# Altium footprint library Ixora.PcbLib: 199 footprints (part 2 of 13)
Each footprint in its own frame and in the unit in brackets; x right, y up, seen from the top. Pads: shape width x height; smd on the part's side, far side on the other; paste and mask are expansions set on the pad; w line width, h text height; cw(c..) or ccw(c..) is an arc to the next point about the centre after c.
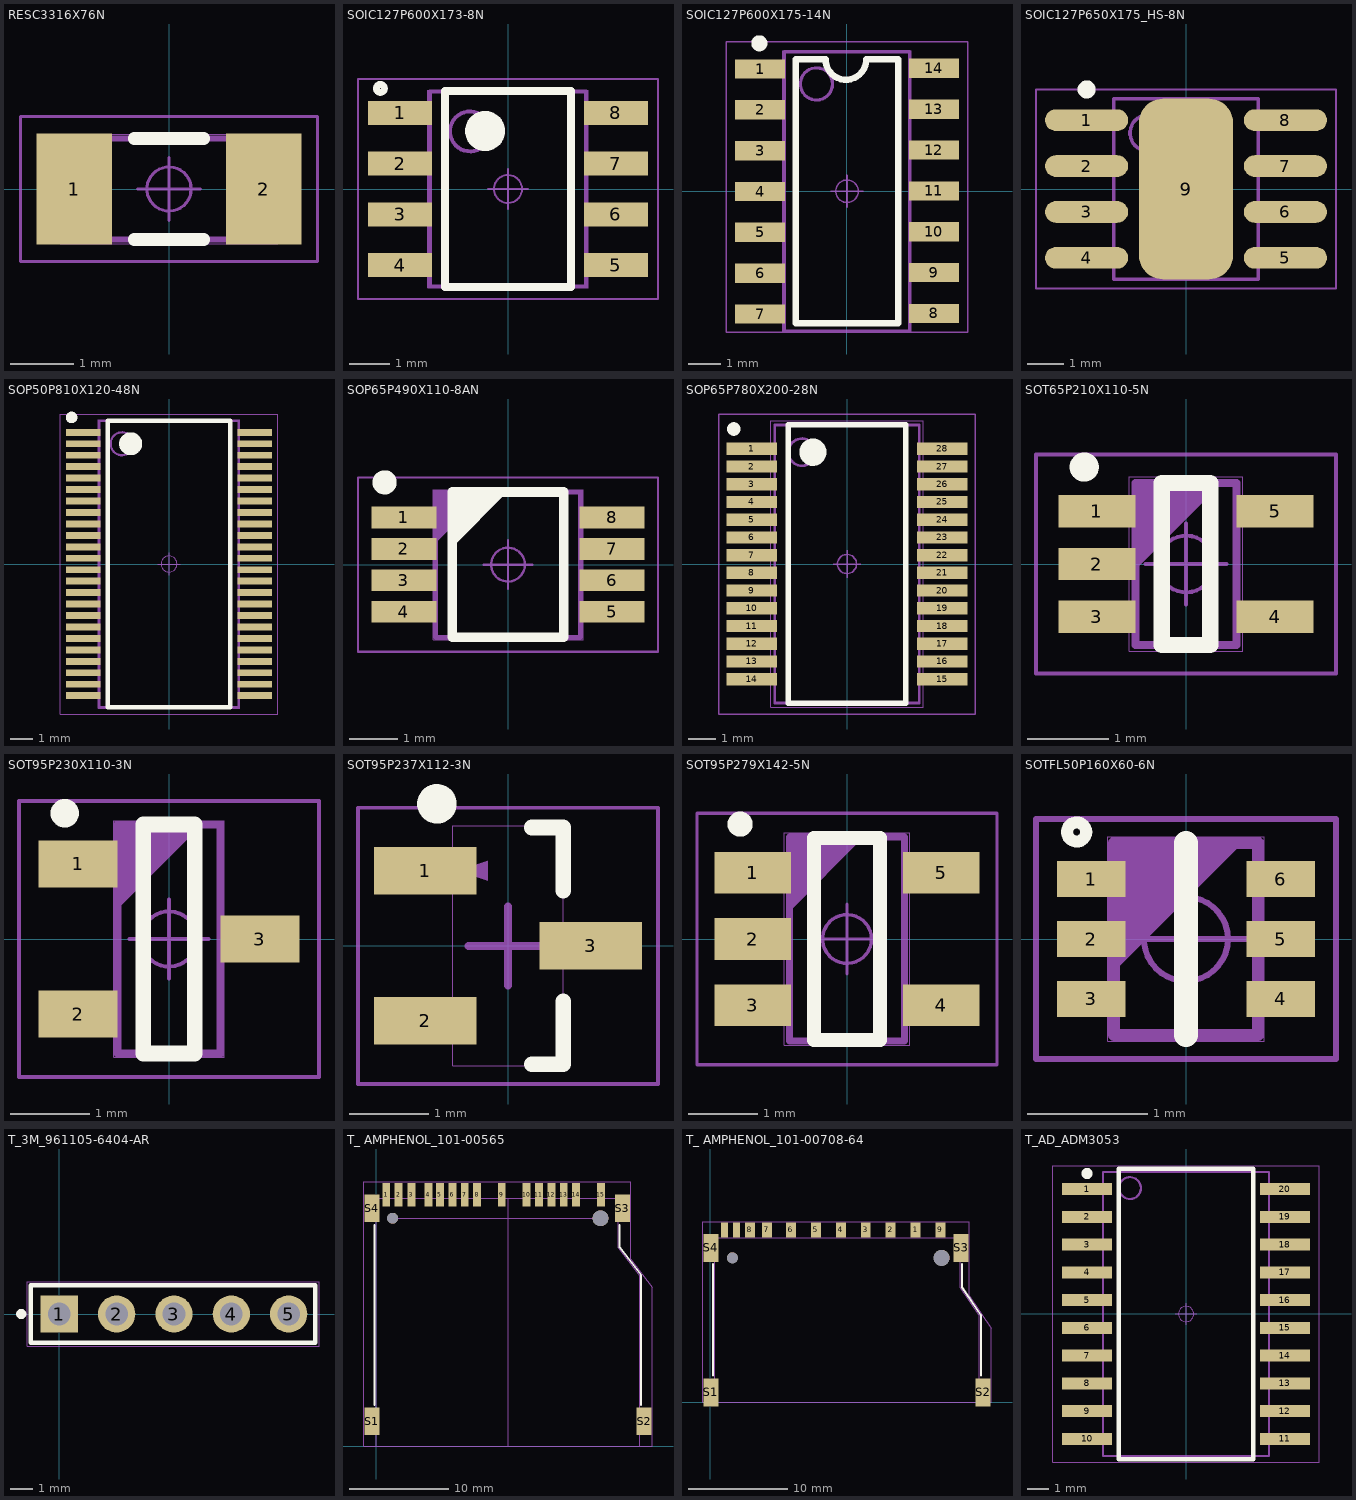
[diagram p1: the footprints below, top view; thin cyan lines are the x and y axes]

## RESC3316X76N [mm]
height 0.6
pads (2):
  rect 1.2x1.75 smd: 1(-1.5,0) 2(1.5,0)
Top Overlay:
  lines w0.2: -0.55,-0.8 0.55,-0.8 ; -0.55,0.8 0.55,0.8
Mechanical 1:
  circle w0.05: c0,0 r0.35
  lines w0.05: -0.5,0 0.5,0 ; 0,-0.5 0,0.5 ; -2.35,-1.15 -2.35,1.15 2.35,1.15 2.35,-1.15 -2.35,-1.15
Mechanical 2:
  lines w0.001: -1.725,-0.865 -1.725,0.865 1.725,0.865 1.725,-0.865 -1.725,-0.865
Mechanical 3:
  lines w0.1: -1.63,-0.8 -1.63,0.8 1.63,0.8 1.63,-0.8 -1.63,-0.8
3D body: height 0.6, standoff 0, extent -1.725,-0.865 1.725,0.865

## SOIC127P600X173-8N [mm]
height 1.75
pads (8):
  rect 1.6x0.6 smd: 1(-2.7,1.905) 2(-2.7,0.635) 3(-2.7,-0.635) 4(-2.7,-1.905) 5(2.7,-1.905) 6(2.7,-0.635) 7(2.7,0.635) 8(2.7,1.905)
Top Overlay:
  circle w0.17: c-3.191,2.515 r0.1
  circle w0.5: c-0.575,1.45 r0.25
  lines w0.2: -1.575,-2.45 -1.575,2.45 1.575,2.45 1.575,-2.45 -1.575,-2.45
Mechanical 1:
  circle w0.05: c0,0 r0.35
  lines w0.05: -0.5,0 0.5,0 ; 0,-0.5 0,0.5 ; -3.75,-2.75 -3.75,2.75 3.75,2.75 3.75,-2.75 -3.75,-2.75
Mechanical 2:
  lines w0.001: -2,-2.475 -2,2.475 2,2.475 2,-2.475 -2,-2.475
Mechanical 3:
  circle w0.1: c-0.95,1.44 r0.5
  lines w0.1: -1.95,-2.44 -1.95,2.44 1.95,2.44 1.95,-2.44 -1.95,-2.44
3D body: height 1.75, standoff 0, extent -2,-2.475 2,2.475

## SOIC127P600X175-14N [mm] "SOIC 14 pin"
height 1.6
pads (14):
  rect 1.55x0.6 smd: 1(-2.7,3.8) 2(-2.7,2.53) 3(-2.7,1.26) 4(-2.7,-0.01) 5(-2.7,-1.28) 6(-2.7,-2.55) 7(-2.7,-3.82) 8(2.7,-3.8) 9(2.7,-2.53) 10(2.7,-1.26) 11(2.7,0.01) 12(2.7,1.28) 13(2.7,2.55) 14(2.7,3.82)
Top Overlay:
  circle w0.25: c-2.725,4.6 r0.125
  lines w0.2: -1.6,-4.1 -1.6,4.1 -0.667,4.1 ccw(c-0.033,4.1) 0.6,4.1 1.6,4.1 1.6,-4.1 -1.6,-4.1
Mechanical 1:
  circle w0.05: c0,0 r0.35
  lines w0.05: -0.5,0 0.5,0 ; 0,-0.5 0,0.5 ; -3.75,-4.384 -3.75,4.645 3.75,4.645 3.75,-4.384 -3.75,-4.384
Mechanical 2:
  lines w0.001: -2,-4.375 -2,4.375 2,4.375 2,-4.375 -2,-4.375
Mechanical 3:
  circle w0.1: c-0.95,3.335 r0.5
  lines w0.1: -1.95,-4.343 1.95,-4.343 1.95,4.335 -1.95,4.335 -1.95,-4.343
3D body: height 1.6, standoff 0, extent -2,-4.375 2,4.375

## SOIC127P650X175_HS-8N [mm] "SOIC, 8-Leads, Body 5.0x4.0mm (max), Pitch 1.27mm, IPC Medium Density"
height 1.75
pads (9):
  oval 2.3x0.6 smd: 1(-2.75,1.905) 2(-2.75,0.635) 3(-2.75,-0.635) 4(-2.75,-1.905) 5(2.75,-1.905) 6(2.75,-0.635) 7(2.75,0.635) 8(2.75,1.905)
  rrect50% 2.6x5 smd: 9(0,0)
Top Overlay:
  circle w0.25: c-2.75,2.755 r0.125
Mechanical 1:
  lines w0.05: -4.15,-2.75 -4.15,2.75 4.15,2.75 4.15,-2.75 -4.15,-2.75
Mechanical 2:
  lines w0.01: -2,-2.5 -2,2.5 2,2.5 2,-2.5 -2,-2.5
Mechanical 3:
  circle w0.1: c-1.05,1.55 r0.5
  lines w0.1: -0.5,0 0.5,0 ; 0,-0.5 0,0.5 ; -2,-2.5 2,-2.5 2,2.5 -2,2.5 -2,-2.5
3D body: height 1.75, standoff 0.1, extent -2,-2.5 2,2.5

## SOP50P810X120-48N [mm]
height 1.1
pads (48):
  rect 1.5x0.3 smd: 1(-3.75,5.75) 2(-3.75,5.25) 3(-3.75,4.75) 4(-3.75,4.25) 5(-3.75,3.75) 6(-3.75,3.25) 7(-3.75,2.75) 8(-3.75,2.25) 9(-3.75,1.75) 10(-3.75,1.25) 11(-3.75,0.75) 12(-3.75,0.25) 13(-3.75,-0.25) 14(-3.75,-0.75) 15(-3.75,-1.25) 16(-3.75,-1.75) 17(-3.75,-2.25) 18(-3.75,-2.75) 19(-3.75,-3.25) 20(-3.75,-3.75) 21(-3.75,-4.25) 22(-3.75,-4.75) 23(-3.75,-5.25) 24(-3.75,-5.75) 25(3.75,-5.75) 26(3.75,-5.25) 27(3.75,-4.75) 28(3.75,-4.25) 29(3.75,-3.75) 30(3.75,-3.25) 31(3.75,-2.75) 32(3.75,-2.25) 33(3.75,-1.75) 34(3.75,-1.25) 35(3.75,-0.75) 36(3.75,-0.25) 37(3.75,0.25) 38(3.75,0.75) 39(3.75,1.25) 40(3.75,1.75) 41(3.75,2.25) 42(3.75,2.75) 43(3.75,3.25) 44(3.75,3.75) 45(3.75,4.25) 46(3.75,4.75) 47(3.75,5.25) 48(3.75,5.75)
Top Overlay:
  circle w0.25: c-4.25,6.4 r0.125
  circle w0.5: c-1.675,5.25 r0.25
  lines w0.2: -2.675,-6.25 -2.675,6.25 2.675,6.25 2.675,-6.25 -2.675,-6.25
Mechanical 1:
  circle w0.05: c0,0 r0.35
  lines w0.05: -0.5,0 0.5,0 ; 0,-0.5 0,0.5 ; -4.75,-6.55 -4.75,6.55 4.75,6.55 4.75,-6.55 -4.75,-6.55
Mechanical 2:
  lines w0.001: -3.1,-6.3 -3.1,6.3 3.1,6.3 3.1,-6.3 -3.1,-6.3
Mechanical 3:
  circle w0.1: c-2.05,5.25 r0.5
  lines w0.1: -3.05,-6.25 -3.05,6.25 3.05,6.25 3.05,-6.25 -3.05,-6.25
3D body: height 1.1, standoff 0, extent -3.1,-6.3 3.1,6.3

## SOP65P490X110-8AN [mm]
height 1.1
pads (8):
  rect 1.35x0.45 smd: 1(-2.15,0.975) 2(-2.15,0.325) 3(-2.15,-0.325) 4(-2.15,-0.975) 5(2.15,-0.975) 6(2.15,-0.325) 7(2.15,0.325) 8(2.15,0.975)
Top Overlay:
  circle w0.25: c-2.55,1.7 r0.125
  lines w0.2: -1.15,0.5 -0.15,1.5 ; -1.15,0.7 -0.35,1.5 ; -1.15,0.9 -0.55,1.5 ; -1.15,1.1 -0.75,1.5 ; -1.15,1.3 -0.95,1.5 ; -1.15,-1.5 1.15,-1.5 1.15,1.5 -1.15,1.5 -1.15,-1.5
Mechanical 1:
  circle w0.05: c0,0 r0.35
  lines w0.05: -0.5,0 0.5,0 ; 0,-0.5 0,0.5 ; -3.1,-1.8 3.1,-1.8 3.1,1.8 -3.1,1.8 -3.1,-1.8
Mechanical 2:
  lines w0.001: -1.55,-1.55 -1.55,1.55 1.55,1.55 1.55,-1.55 -1.55,-1.55
Mechanical 3:
  lines w0.1: -1.5,0.5 -0.5,1.5 ; -1.5,0.6 -0.6,1.5 ; -1.5,0.7 -0.7,1.5 ; -1.5,0.8 -0.8,1.5 ; -1.5,0.9 -0.9,1.5 ; -1.5,1 -1,1.5 ; -1.5,1.1 -1.1,1.5 ; -1.5,1.2 -1.2,1.5 ; -1.5,1.3 -1.3,1.5 ; -1.5,1.4 -1.4,1.5 ; -1.5,-1.5 -1.5,1.5 1.5,1.5 1.5,-1.5 -1.5,-1.5
3D body: height 1.1, standoff 0, extent -1.55,-1.55 1.55,1.55

## SOP65P780X200-28N [mm]
height 2
pads (28):
  rect 1.85x0.45 smd: 1(-3.5,4.225) 2(-3.5,3.575) 3(-3.5,2.925) 4(-3.5,2.275) 5(-3.5,1.625) 6(-3.5,0.975) 7(-3.5,0.325) 8(-3.5,-0.325) 9(-3.5,-0.975) 10(-3.5,-1.625) 11(-3.5,-2.275) 12(-3.5,-2.925) 13(-3.5,-3.575) 14(-3.5,-4.225) 15(3.5,-4.225) 16(3.5,-3.575) 17(3.5,-2.925) 18(3.5,-2.275) 19(3.5,-1.625) 20(3.5,-0.975) 21(3.5,-0.325) 22(3.5,0.325) 23(3.5,0.975) 24(3.5,1.625) 25(3.5,2.275) 26(3.5,2.925) 27(3.5,3.575) 28(3.5,4.225)
Top Overlay:
  circle w0.25: c-4.15,4.95 r0.125
  circle w0.5: c-1.25,4.1 r0.25
  lines w0.2: -2.159,-5.1 -2.159,5.1 2.159,5.1 2.159,-5.1 -2.159,-5.1
Mechanical 1:
  circle w0.05: c0,0 r0.35
  lines w0.05: -0.5,0 0.5,0 ; 0,-0.5 0,0.5 ; -4.7,-5.5 -4.7,5.5 4.7,5.5 4.7,-5.5 -4.7,-5.5
Mechanical 2:
  lines w0.001: -2.8,-5.25 -2.8,5.25 2.8,5.25 2.8,-5.25 -2.8,-5.25
Mechanical 3:
  circle w0.1: c-1.65,4.1 r0.5
  lines w0.1: -2.65,-5.1 -2.65,5.1 2.65,5.1 2.65,-5.1 -2.65,-5.1
3D body: height 2, standoff 0, extent -2.8,-5.25 2.8,5.25

## SOT65P210X110-5N [mm]
height 1.1
pads (5):
  rect 0.95x0.4 smd: 1(-1.1,0.65) 2(-1.1,0) 3(-1.1,-0.65) 4(1.1,-0.65) 5(1.1,0.65)
Top Overlay:
  circle w0.2: c-1.255,1.195 r0.08
  lines w0.2: -0.3,-1 -0.3,1 0.3,1 0.3,-1 -0.3,-1
Mechanical 1:
  circle w0.05: c0,0 r0.35
  lines w0.05: -0.5,0 0.5,0 ; 0,-0.5 0,0.5 ; -1.85,-1.35 -1.85,1.35 1.85,1.35 1.85,-1.35 -1.85,-1.35
Mechanical 2:
  lines w0.001: -0.7,-1.075 -0.7,1.075 0.7,1.075 0.7,-1.075 -0.7,-1.075
Mechanical 3:
  lines w0.1: -0.625,0 0.375,1 ; -0.625,0.1 0.275,1 ; -0.625,0.2 0.175,1 ; -0.625,0.3 0.075,1 ; -0.625,0.4 -0.025,1 ; -0.625,0.5 -0.125,1 ; -0.625,0.6 -0.225,1 ; -0.625,0.7 -0.325,1 ; -0.625,0.8 -0.425,1 ; -0.625,0.9 -0.525,1 ; -0.625,-1 -0.625,1 0.625,1 0.625,-1 -0.625,-1
3D body: height 1.1, standoff 0, extent -0.7,-1.075 0.7,1.075

## SOT95P230X110-3N [mm]
height 1.12
pads (3):
  rect 1x0.6 smd: 1(-1.15,0.95) 2(-1.15,-0.95) 3(1.15,0)
Top Overlay:
  circle w0.2: c-1.321,1.593 r0.08
  lines w0.2: -0.325,-1.45 0.325,-1.45 0.325,1.45 -0.325,1.45 -0.325,-1.45
Mechanical 1:
  circle w0.05: c0,0 r0.35
  lines w0.05: -0.5,0 0.5,0 ; 0,-0.5 0,0.5 ; -1.9,-1.75 1.9,-1.75 1.9,1.75 -1.9,1.75 -1.9,-1.75
Mechanical 2:
  lines w0.001: -0.7,-1.5 0.7,-1.5 0.7,1.5 -0.7,1.5 -0.7,-1.5
Mechanical 3:
  lines w0.1: -0.65,0.45 0.35,1.45 ; -0.65,0.55 0.25,1.45 ; -0.65,0.65 0.15,1.45 ; -0.65,0.75 0.05,1.45 ; -0.65,0.85 -0.05,1.45 ; -0.65,0.95 -0.15,1.45 ; -0.65,1.05 -0.25,1.45 ; -0.65,1.15 -0.35,1.45 ; -0.65,1.25 -0.45,1.45 ; -0.65,1.35 -0.55,1.45 ; -0.65,-1.45 0.65,-1.45 0.65,1.45 -0.65,1.45 -0.65,-1.45
3D body: height 1.12, standoff 0, extent -0.7,-1.5 0.7,1.5

## SOT95P237X112-3N [mm] "SOT23, 3-Leads, Body 3.0x2.6mm (max), Pitch 0.95mm, IPC Medium Density"
height 1.12
pads (3):
  rect 1.3x0.6 smd: 1(-1.05,0.95) 2(-1.05,-0.95) 3(1.05,0)
Top Overlay:
  circle w0.25: c-0.9,1.8 r0.125
  lines w0.2: 0.3,-1.5 0.7,-1.5 0.7,-0.7 ; 0.3,1.5 0.7,1.5 0.7,0.7
Mechanical 1:
  lines w0.05: -1.9,-1.75 1.9,-1.75 1.9,1.75 -1.9,1.75 -1.9,-1.75
Mechanical 2:
  lines w0.001: -0.7,-1.52 -0.7,1.52 0.7,1.52 0.7,-1.52 -0.7,-1.52
Mechanical 3:
  region: -0.635,0.95 -0.254,1.077 -0.254,0.823
  lines w0.1: -0.5,0 0.5,0 ; 0,-0.5 0,0.5
3D body: height 1.12, standoff 0.2, extent -0.7,-1.52 0.7,1.52

## SOT95P279X142-5N [mm]
height 1.1
pads (5):
  rect 1.1x0.6 smd: 1(-1.35,0.95) 2(-1.35,0) 3(-1.35,-0.95) 4(1.35,-0.95) 5(1.35,0.95)
Top Overlay:
  circle w0.2: c-1.533,1.646 r0.08
  lines w0.2: -0.475,-1.45 -0.475,1.45 0.475,1.45 0.475,-1.45 -0.475,-1.45
Mechanical 1:
  circle w0.05: c0,0 r0.35
  lines w0.05: -0.5,0 0.5,0 ; 0,-0.5 0,0.5 ; -2.15,-1.8 -2.15,1.8 2.15,1.8 2.15,-1.8 -2.15,-1.8
Mechanical 2:
  lines w0.001: -0.9,-1.52 -0.9,1.52 0.9,1.52 0.9,-1.52 -0.9,-1.52
Mechanical 3:
  lines w0.1: -0.825,0.46 0.175,1.46 ; -0.825,0.56 0.075,1.46 ; -0.825,0.66 -0.025,1.46 ; -0.825,0.76 -0.125,1.46 ; -0.825,0.86 -0.225,1.46 ; -0.825,0.96 -0.325,1.46 ; -0.825,1.06 -0.425,1.46 ; -0.825,1.16 -0.525,1.46 ; -0.825,1.26 -0.625,1.46 ; -0.825,1.36 -0.725,1.46 ; -0.825,-1.46 -0.825,1.46 0.825,1.46 0.825,-1.46 -0.825,-1.46
3D body: height 1.1, standoff 0, extent -0.9,-1.52 0.9,1.52

## SOTFL50P160X60-6N [mm]
height 0.6
pads (6):
  rect 0.57x0.3 smd: 1(-0.79,0.5) 2(-0.79,0) 3(-0.79,-0.5) 4(0.79,-0.5) 5(0.79,0) 6(0.79,0.5)
Top Overlay:
  circle w0.1: c-0.911,0.892 r0.08
  lines w0.2: 0,-0.8 0,0.8
Mechanical 1:
  circle w0.05: c0,0 r0.35
  lines w0.05: -0.5,0 0.5,0 ; 0,-0.5 0,0.5 ; -1.25,-1 1.25,-1 1.25,1 -1.25,1 -1.25,-1
Mechanical 2:
  lines w0.001: -0.65,-0.85 0.65,-0.85 0.65,0.85 -0.65,0.85 -0.65,-0.85
Mechanical 3:
  lines w0.1: -0.6,-0.2 0.4,0.8 ; -0.6,-0.1 0.3,0.8 ; -0.6,0 0.2,0.8 ; -0.6,0.1 0.1,0.8 ; -0.6,0.2 0,0.8 ; -0.6,0.3 -0.1,0.8 ; -0.6,0.4 -0.2,0.8 ; -0.6,0.5 -0.3,0.8 ; -0.6,0.6 -0.4,0.8 ; -0.6,0.7 -0.5,0.8 ; -0.6,-0.8 0.6,-0.8 0.6,0.8 -0.6,0.8 -0.6,-0.8
3D body: height 0.6, standoff 0, extent -0.65,-0.85 0.65,0.85

## T_3M_961105-6404-AR [mm] "Connector; Header; 35 Position"
height 8.4
pads (5):
  rect 1.65x1.65 hole 1: 1(0,0)
  round 1.65 hole 1: 2(2.54,0) 3(5.08,0) 4(7.62,0) 5(10.16,0)
Top Overlay:
  circle w0.25: c-1.687,0 r0.1
  lines w0.2: -1.27,-1.27 11.344,-1.27 11.344,1.27 -1.27,1.27 -1.27,-1.27
Mechanical 1:
  lines w0.05: -1.43,-1.43 -1.43,1.43 11.504,1.43 11.504,-1.43 -1.43,-1.43
Mechanical 2:
  lines w0.001: -1.27,-1.27 11.344,-1.27 11.344,1.27 -1.27,1.27 -1.27,-1.27
Mechanical 3:
  lines w0.1: -1.27,-1.27 11.344,-1.27 11.344,1.27 -1.27,1.27 -1.27,-1.27
3D body "Samtec-TSW-105-07-G-S, Jumper with 5 pins, male.step": height 8.4, standoff -2.52, extent -1.27,-1.27 11.43,1.27

## T_ AMPHENOL_101-00565 [mm] "SD/MMC 8bit Card Holder"
height 2.85
pads (21):
  rect 0.8x2.35 smd: 1(1,25.375) 2(2.25,25.375) 3(3.55,25.375) 4(5.25,25.375) 5(6.43,25.375) 6(7.68,25.375) 7(8.93,25.375) 8(10.18,25.375) 9(12.67,25.375) 10(15.18,25.375) 11(16.43,25.375) 12(17.68,25.375) 13(18.93,25.375) 14(20.18,25.375) 15(22.68,25.375)
  rect 1.5x2.8 smd: S1(-0.45,2.5) S2(27.05,2.5) S3(24.86,24) S4(-0.45,24)
  round 1.1 hole 1.1 unplated: ""(1.65,23)
  round 1.6 hole 1.6 unplated: ""(22.65,23)
Top Overlay:
  lines w0.2: -0.2,4.125 -0.2,22.345 ; 24.575,22.345 24.575,20.055 26.755,17.268 26.755,4.125
Mechanical 1:
  lines w0.05: -1.29,0 -1.29,26.665 25.7,26.665 25.7,18.856 27.89,16.056 27.89,0 -1.29,0
Mechanical 2:
  lines w0.01: 0,1.5 -0.7,1.5 -0.7,3.5 0,3.5 ; 0,23 -0.7,23 -0.7,25 -0.11,25 24.41,25 ; 0,25 0,0 26.6,0 26.6,17.2 24.41,20 24.41,25 ; 1.65,23 22.65,23 ; 13.3,0 13.3,25 ; 24.41,23 25.11,23 25.11,25 24.41,25 ; 26.6,1.5 27.3,1.5 27.3,3.5 26.6,3.5
Mechanical 3:
  lines w0.1: 0,0 26.6,0 26.6,17.2 24.41,20 24.41,25 0,25 0,0
3D body: height 0.6, standoff 0, extent 24.41,23 25.11,25
3D body: height 0.6, standoff 0, extent -0.7,1.5 0,3.5
3D body: height 0.6, standoff 0, extent 26.6,1.5 27.3,3.5
3D body: height 3.45, standoff 0, extent 0,0 26.6,25
3D body: height 0.6, standoff 0, extent -0.7,23 0,25

## T_ AMPHENOL_101-00708-64 [mm] "SD/MMC Card Holder"
height 2.85
pads (17):
  rect 1x1.5 smd: 1(20.59,17.3) 2(18.09,17.3) 3(15.59,17.3) 4(13.09,17.3) 5(10.59,17.3) 6(8.09,17.3) 7(5.67,17.3) 8(3.97,17.3) 9(23.09,17.3)
  rect 0.7x1.5 smd: 10(2.63,17.3) 11(1.43,17.3)
  rect 1.5x2.8 smd: S1(0.06,1) S2(27.36,1) S3(25.16,15.5) S4(0.06,15.5)
  round 1.1 hole 1.1 unplated: ""(2.21,14.5)
  round 1.6 hole 1.6 unplated: ""(23.21,14.5)
Top Overlay:
  lines w0.2: 0.25,2.68 0.25,13.88 ; 25.255,13.88 25.255,11.552 27.14,8.759 27.14,2.68
Mechanical 1:
  lines w0.05: -0.775,0 -0.775,18.125 26,18.125 26,10.702 28.195,7.45 28.195,0 -0.775,0
Mechanical 2:
  lines w0.001: 0.45,0 0,0 0,2 0.45,2 ; 0.45,14.5 0,14.5 0,16.5 0.45,16.5 ; 25.08,14.5 25.5,14.5 25.5,16.5 25.08,16.5 ; 26.97,0 27.39,0 27.39,2 26.97,2
  lines w0.01: 0.45,0 26.97,0 26.97,8.7 25.08,11.5 25.08,16.5 0.45,16.5 0.45,0
Mechanical 3:
  lines w0.1: 0.45,0 0.45,16.5 25.08,16.5 25.08,11.5 26.97,8.7 26.97,0 0.45,0
3D body: height 2.85, standoff 0, extent 0.45,0 26.97,16.5
3D body: height 0.6, standoff 0, extent 25.08,14.5 25.5,16.5
3D body: height 0.6, standoff 0, extent 0,14.5 0.45,16.5
3D body: height 0.6, standoff 0, extent 0,0 0.45,2
3D body: height 0.6, standoff 0, extent 26.97,0 27.39,2

## T_AD_ADM3053 [mil] "Signal and Power Isolated CAN Transceiver  with Integrated Isolated DC-to-DC Converter"
height 104.33
pads (20):
  rect 90.5x22 smd: 1(-178.25,225) 2(-178.25,175) 3(-178.25,125) 4(-178.25,75) 5(-178.25,25) 6(-178.25,-25) 7(-178.25,-75) 8(-178.25,-125) 9(-178.25,-175) 10(-178.25,-225) 11(178.25,-225) 12(178.25,-175) 13(178.25,-125) 14(178.25,-75) 15(178.25,-25) 16(178.25,25) 17(178.25,75) 18(178.25,125) 19(178.25,175) 20(178.25,225)
Top Overlay:
  circle w9.84: c-178.25,253.15 r4.92
  lines w7.87: -121.06,-261.81 -121.06,261.81 121.06,261.81 121.06,-261.81 -121.06,-261.81
Mechanical 1:
  lines w1.97: -240.16,-266.73 240.16,-266.73 240.16,266.73 -240.16,266.73 -240.16,-266.73
Mechanical 2:
  lines w0.39: -149.61,-255.91 -149.61,255.91 149.61,255.91 149.61,-255.91 -149.61,-255.91
Mechanical 3:
  circle w1.97: c0,0 r13.78
  circle w3.94: c-100.98,226.89 r19.68
  lines w1.97: -19.68,0 19.68,0 ; 0,-19.68 0,19.68
  lines w3.94: -149.8,-255.91 -149.8,255.91 149.61,255.91 149.61,-255.91 -149.8,-255.91
3D body: height 104.33, standoff 0, extent -149.61,-255.91 149.61,255.91